# Altium footprint library My Library.PcbLib: 872 footprints (part 41 of 55)
Each footprint in its own frame and in the unit in brackets; x right, y up, seen from the top. Pads: shape width x height; smd on the part's side, far side on the other; paste and mask are expansions set on the pad; w line width, h text height; cw(c..) or ccw(c..) is an arc to the next point about the centre after c.
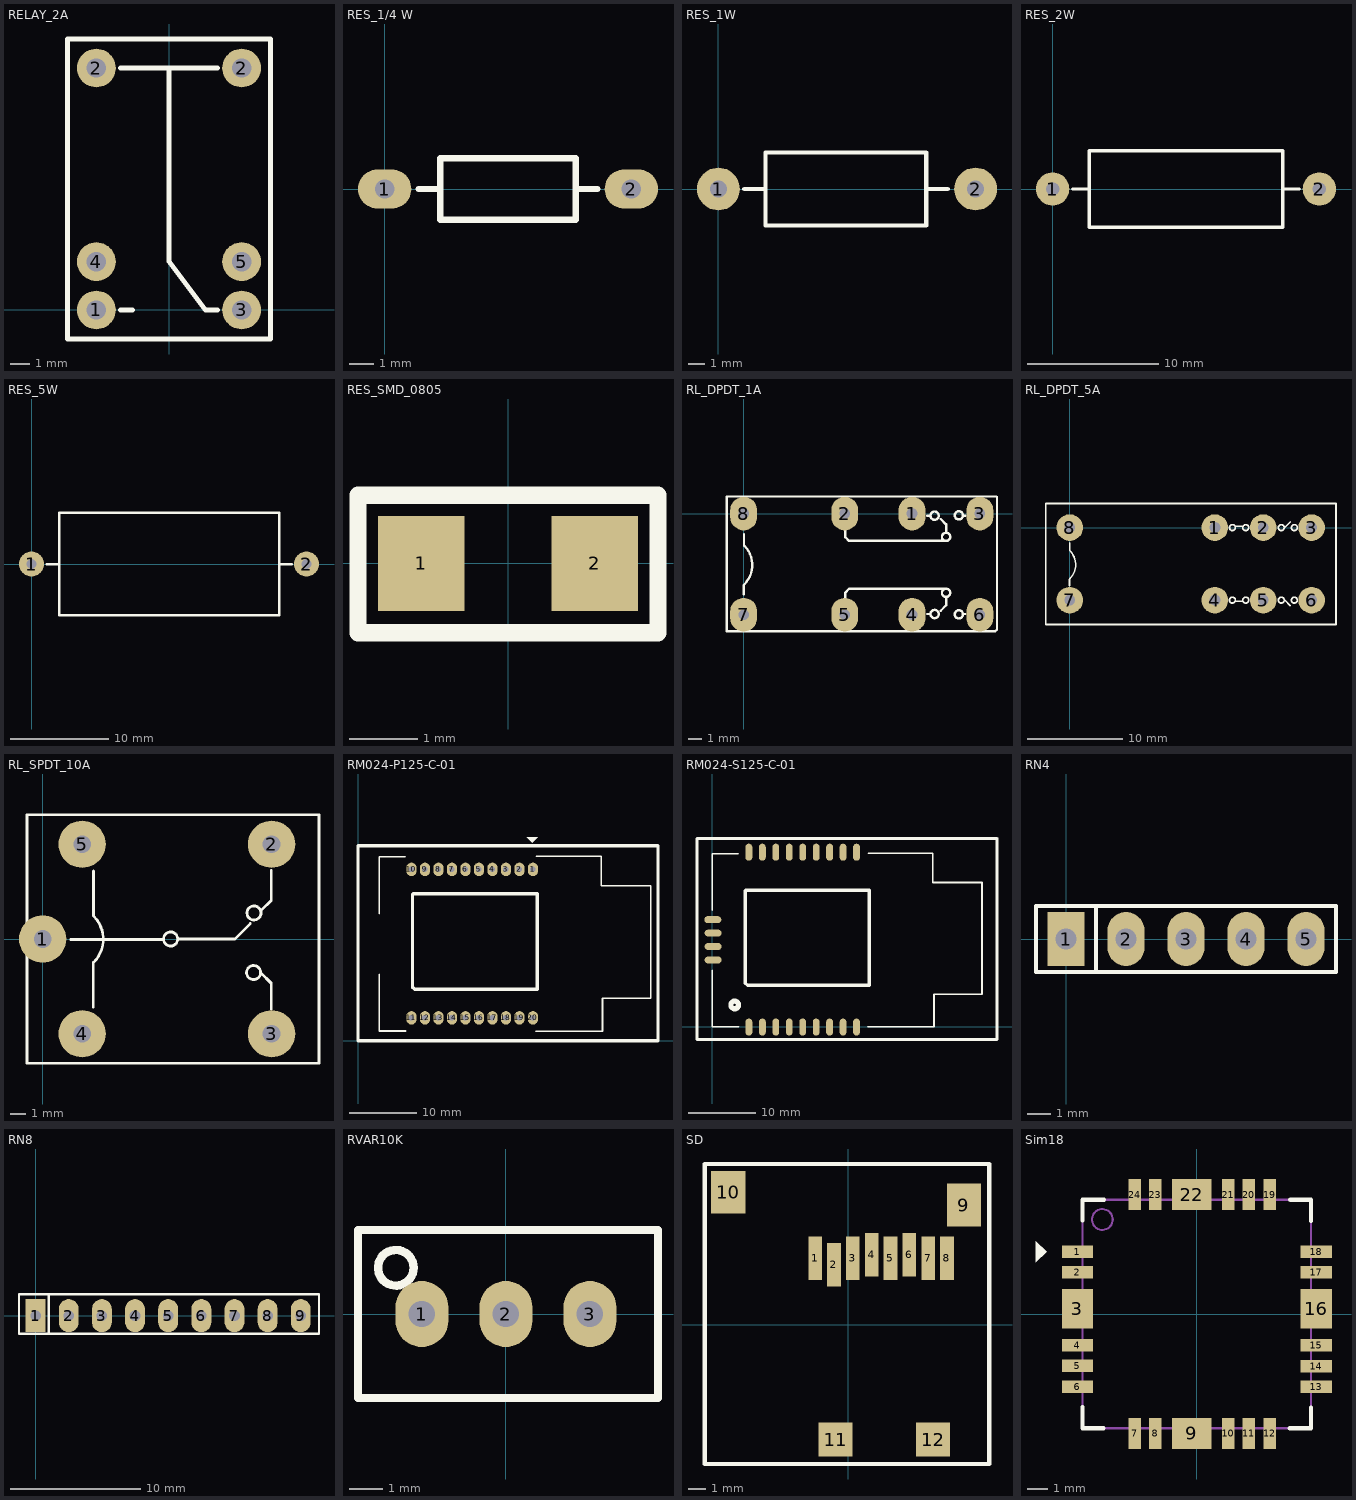
[diagram p40: the footprints below, top view; thin cyan lines are the x and y axes]

## RELAY_2A [mil] "RELAY 6"
pads (6):
  round 80 hole 40: 1(-150,0) 2(-150,500) 2(150,500) 3(150,0) 4(-150,100) 5(150,100)
Top Overlay:
  lines w10: -100,0 -75,0 ; -100,500 100,500 ; 0,500 0,100 75,0 100,0 ; -210,-60 210,-60 210,560 -210,560 -210,-60
3D body "User Library-HK4100F.STEP": height 465.46, standoff -107.76, extent -204.72,-53.14 204.72,553.16

## RES_1/4 W [mm]
pads (2):
  oval 2.2x1.6 hole 0.787: 1(0,0) 2(10.16,0)
Top Overlay:
  lines w0.254: 1.397,0 2.286,0 ; 7.874,0 8.763,0 ; 2.286,-1.27 7.874,-1.27 7.874,1.27 2.286,1.27 2.286,-1.27
3D body "User Library-Res40-Axial 0_25W-1R.STEP": height 2.49, standoff -1.92, extent -0.3,-1.2 10.46,1.2

## RES_1W [mil]
pads (2):
  round 100 hole 40: 1(0,0) 2(600,0)
Top Overlay:
  lines w10: 60,0 110,0 ; 485,0 535,0 ; 110,0 110,85 485,85 485,-85 110,-85 110,0
3D body "User Library-PR02.STEP": height 176.77, standoff -310.6, extent -15,-76.77 616.49,76.77

## RES_2W [mil]
pads (2):
  round 100 hole 40: 1(0,0) 2(800,0)
Top Overlay:
  lines w10: 60,0 110,0 ; 690,0 740,0 ; 110,0 110,115 690,115 690,-115 110,-115 110,0
3D body "User Library-Res80 2W SilCoat.STEP": height 227.17, standoff -59.06, extent -13.94,-107.26 817.95,109.28

## RES_5W [mil]
pads (2):
  round 100 hole 40: 1(0,0) 2(1100,0)
Top Overlay:
  lines w10: 60,0 110,0 ; 990,0 1040,0 ; 110,0 110,-205 990,-205 990,205 110,205 110,0
3D body "User Library-Cement Fixed Resistors 5W 1K5 PCB Horizontal.STEP": height 354.83, standoff -141.23, extent -15,-196.85 1114.53,196.85

## RES_SMD_0805 [mil]
pads (2):
  rect 50x55 smd: 1(-50,0) 2(50,0)
Top Overlay:
  lines w10: -86.61,-40 86.61,-40 86.61,39.37 -86.61,39.37 -86.61,-40
3D body "User Library-RES_2013-0805.STEP": height 30.42, standoff 0.5, extent -45.27,-26.57 45.28,26.58

## RL_DPDT_1A [mil] "Reley DPDT, 8 pin, 1A, W400mil, L800mil,H 300mil"
height 300
pads (8):
  oval 80x100 hole 32: 1(500,0) 2(300,0) 3(701,0) 4(500,-300) 5(300,-300) 6(701,-300) 7(0,-300) 8(0,0)
Top Overlay:
  circle w7: c638.76,-5 r12.24
  circle w7: c566.76,-6 r12.24
  circle w7: c600.76,-69 r12.24
  circle w7: c600.76,-235 r12.24
  circle w7: c566.76,-298 r12.24
  circle w7: c638.76,-299 r12.24
  lines w7: 0,-239 0,-212 ; 1,-211 ccw(c-56.5,-152.5) 2,-95 ; 1,-94 1,-61 ; 302,-255 302,-234 313,-223 599,-223 ; 302,-42 302,-70 313,-81 599,-81 ; 544,-298 552,-298 ; 544,-6 552,-6 ; 585,-288 601,-272 601,-249 ; 585,-16 601,-32 601,-55 ; 653,-298 658,-298 ; 653,-6 658,-6 ; -50,-349 747,-349 752,-344 752,49 750,51 -50,51 -50,-349
3D body "SW3dPS-DSY2Y.STEP": height 484.25, standoff -118.11, extent -59.45,-340 759.45,45.83

## RL_DPDT_5A [mil] "Reley DPDT, 8 pin, 5A, W500mil, L1100mil,H 950mil"
height 300
pads (8):
  round 110 hole 45: 1(600,0) 2(800,0) 3(1000,0) 4(600,-300) 5(800,-300) 6(1000,-300) 7(0,-300) 8(0,0)
Top Overlay:
  circle w7: c928.76,0 r12.24
  circle w7: c874.76,0 r12.24
  circle w7: c727.76,0 r12.24
  circle w7: c672.76,0 r12.24
  circle w7: c672.76,-300 r12.24
  circle w7: c727.76,-300 r12.24
  circle w7: c874.76,-300 r12.24
  circle w7: c928.76,-300 r12.24
  lines w7: -1,-240 -1,-213 ; 0,-212 ccw(c-57.5,-153.5) 1,-96 ; 0,-95 0,-62 ; 687,-305 716,-305 ; 687,5 716,5 ; 888,-299 912,-323 ; 888,-1 912,23 ; -99,-401 -99,100 1101,100 1101,-401 -99,-401

## RL_SPDT_10A [mil] "Relay SPDT, 5 pin, 10A,W 650mil, L 800mil, H 800mil"
height 800
pads (5):
  round 120 hole 45: 1(0,0) 2(580,240) 3(580,-240) 4(100,-240) 5(100,240)
Top Overlay:
  circle w7: c534.2,-85 r17.8
  circle w7: c535.2,66 r17.8
  circle w7: c324.2,0 r17.8
  lines w7: 71,-1 304,-1 ; 128,-173 128,-60 ; 129,-59 ccw(c71.5,-0.5) 130,57 ; 129,58 129,172 ; 344,0 487,0 526,39 ; 552,-85 579,-112 579,-178 ; 553,72 579,98 579,174 ; -40,-315 -40,315 700,315 700,-315 -40,-315

## RM024-P125-C-01 [mm]
height 10
pads (20):
  oval 1.5x2 hole 0.8: 1(25.918,25.417) 2(23.918,25.417) 3(21.918,25.417) 4(19.918,25.417) 5(17.918,25.417) 6(15.918,25.417) 7(13.918,25.417) 8(11.918,25.417) 9(9.918,25.417) 10(7.918,25.417) 11(7.918,3.417) 12(9.918,3.417) 13(11.918,3.417) 14(13.918,3.417) 15(15.918,3.417) 16(17.918,3.417) 17(19.918,3.417) 18(21.918,3.417) 19(23.918,3.417) 20(25.918,3.417)
Top Overlay:
  region: 24.981,30.213 26.657,30.213 25.819,29.375
  lines w0.254: 3.146,1.494 3.146,9.85 ; 3.146,18.867 3.15,27.28 7.006,27.28 ; 3.171,1.468 7.057,1.468 ; 26.361,1.443 36.22,1.443 36.22,6.325 43.383,6.325 43.383,22.987 36.043,22.987 36.043,27.351 26.412,27.351
  lines w0.508: 8.073,21.763 8.073,7.971 8.403,7.641 26.514,7.641 26.539,7.666 26.539,21.814 8.149,21.814 ; 0,0 44.45,0 44.45,28.9 0,28.9 0,0
3D body: height 5, standoff -1, extent 7.429,25.018 8.225,25.816
3D body: height 5, standoff -1, extent 9.429,25.018 10.225,25.816
3D body: height 5, standoff -1, extent 11.429,25.018 12.225,25.816
3D body: height 5, standoff -1, extent 13.429,25.018 14.225,25.816
3D body: height 5, standoff -1, extent 15.429,25.018 16.225,25.816
3D body: height 5, standoff -1, extent 17.429,25.018 18.225,25.816
3D body: height 5, standoff -1, extent 19.429,25.018 20.225,25.816
3D body: height 5, standoff -1, extent 21.429,25.018 22.225,25.816
3D body: height 5, standoff -1, extent 23.429,25.018 24.225,25.816
3D body: height 5, standoff -1, extent 25.429,25.018 26.225,25.816
3D body: height 5, standoff -1, extent 23.429,3.018 24.225,3.816
3D body: height 5, standoff -1, extent 25.429,3.018 26.225,3.816
3D body: height 5, standoff -1, extent 19.429,3.018 20.225,3.816
3D body: height 5, standoff -1, extent 21.429,3.018 22.225,3.816
3D body: height 5, standoff -1, extent 15.429,3.018 16.225,3.816
3D body: height 5, standoff -1, extent 17.429,3.018 18.225,3.816
3D body: height 5, standoff -1, extent 11.429,3.018 12.225,3.816
3D body: height 5, standoff -1, extent 13.429,3.018 14.225,3.816
3D body: height 5, standoff -1, extent 9.429,3.018 10.225,3.816
3D body: height 5, standoff -1, extent 7.429,3.018 8.225,3.816
3D body: height 6, standoff 5.5, extent 3.073,0.813 35.204,27.965
3D body: height 7, standoff 6, extent 3.124,1.422 43.485,27.457
3D body: height 8, standoff 6.5, extent 6.16,4.191 29.147,24.968

## RM024-S125-C-01 [mil]
pads (22):
  oval 40x100 smd: 1(214.84,-1.19) 2(293.84,-1.19) 3(372.84,-1.19) 4(451.84,-1.19) 5(530.84,-1.19) 6(609.84,-1.19) 7(688.84,-1.19) 8(767.84,-1.19) 9(846.84,-1.19) 10(846.84,1025.81) 11(767.84,1025.81) 12(688.84,1025.81) 13(609.84,1025.81) 14(530.84,1025.81) 15(451.84,1025.81) 16(372.84,1025.81) 17(293.84,1025.81) 18(214.84,1025.81)
  oval 100x40 smd: 19(2.84,629.81) 20(4.84,550.81) 21(4.84,471.81) 22(4.84,392.81)
Top Overlay:
  circle w30: c131.17,128.81 r22.67
  lines w10: -0.16,1.81 -0.16,330.81 ; -0.16,685.81 0,1017 151.84,1017 ; 0.84,0.81 153.84,0.81 ; 913.84,-0.19 1302,-0.19 1302,192 1584,192 1584,848 1295,848 1295,1019.81 915.84,1019.81
  lines w20: 193.84,799.81 193.84,256.81 206.84,243.81 919.84,243.81 920.84,244.81 920.84,801.81 196.84,801.81 ; 1670,-74 -90,-74 -90,1106 1671,1106 1672,1105 1672,-74
3D body: height 118.11, standoff 1, extent 118.5,108 1023.5,926
3D body: height 39.37, standoff 0, extent -1,-1 1588,1024

## RN4 [mil] "R SIP4, 5 Pin"
height 200
pads (5):
  rect 62x90 hole 35: 1(0,0)
  oval 62x90 hole 35: 2(100,0) 3(200,0) 4(300,0) 5(400,0)
Top Overlay:
  lines w7: 50,-55 50,55 ; -50,-55 -50,55 450,55 450,-55 -50,-55

## RN8 [mil] "R SIP8, 9 Pin"
height 200
pads (9):
  rect 60x100 hole 32: 1(0,0)
  oval 60x100 hole 32: 2(100,0) 3(200,0) 4(300,0) 5(400,0) 6(500,0) 7(600,0) 8(700,0) 9(800,0)
Top Overlay:
  lines w7: 40,-55 40,65 ; -50,-55 -50,65 855,65 855,-55 -50,-55
3D body "SW3dPS-Resistor Networks-1.STEP": height 259.29, standoff -75.35, extent -42.91,-44.21 842.91,5

## RVAR10K [mm] "Bien tro vi chinh"
pads (3):
  oval 1.6x2 hole 0.8: 1(-2.54,0) 2(0,0) 3(2.54,0)
Top Overlay:
  circle w0.254: c-3.327,1.397 r0.539
  lines w0.254: -4.47,-2.54 -4.47,2.54 4.597,2.54 4.597,-2.54 -4.47,-2.54
3D body "User Library-Potenciometro Vertical.step": height 12.02, standoff -5.48, extent -4.537,-2.4 4.663,2.4

## SD [mm]
pads (12):
  rect 0.8x2.54 smd: 1(-1.925,3.9) 2(-0.825,3.5) 3(0.275,3.9) 4(1.375,4.1) 5(2.475,3.9) 6(3.575,4.1) 7(4.675,3.9) 8(5.775,3.9)
  rect 2x2.5 smd: 9(6.765,7) 10(-7,7.75)
  rect 2x2 smd: 11(-0.735,-6.7) 12(4.965,-6.7)
Top Overlay:
  lines w0.254: -8.382,-8.128 8.255,-8.128 8.255,9.398 -8.382,9.398 -8.382,-8.128
3D body: height 1.85, standoff 0, extent -7.025,-7.045 7.025,8.255

## Sim18 [mm]
height 3
pads (24):
  rect 1.5x0.6 smd: 1(-5.75,3.005) 2(-5.75,2.005) 4(-5.75,-1.5) 5(-5.75,-2.5) 6(-5.75,-3.5) 13(5.75,-3.505) 14(5.75,-2.505) 15(5.75,-1.505) 17(5.75,2) 18(5.75,3)
  rect 1.5x1.9 smd: 3(-5.75,0.253) 16(5.75,0.247)
  rect 0.6x1.5 smd: 7(-3,-5.75) 8(-2,-5.75) 10(1.505,-5.75) 11(2.505,-5.75) 12(3.505,-5.75) 19(3.505,5.75) 20(2.505,5.75) 21(1.505,5.75) 23(-2,5.75) 24(-3,5.75)
  rect 1.9x1.5 smd: 9(-0.247,-5.75) 22(-0.247,5.75)
Top Overlay:
  region: -7.745,3.499 -7.237,2.991 -7.745,2.483
  lines w0.2: -5.5,-4.475 -5.5,-5.5 -4.5,-5.5 ; -5.5,4.5 -5.5,5.5 -4.475,5.5 ; 4.475,-5.5 5.5,-5.5 5.5,-4.5 ; 4.5,5.5 5.5,5.5 5.5,4.475
Mechanical 13:
  circle w0.1: c-4.55,4.55 r0.5
  lines w0.1: -5.5,-5.5 5.5,-5.5 5.5,5.5 -5.5,5.5 -5.5,-5.5
3D body: height 1, standoff 0, extent -5.5,-5.5 5.5,5.5
3D body: height 2, standoff 1, extent -5.08,-5.08 5.08,5.08